# Altium footprint library DBLib.PcbLib: 97 footprints (part 1 of 7)
Each footprint in its own frame and in the unit in brackets; x right, y up, seen from the top. Pads: shape width x height; smd on the part's side, far side on the other; paste and mask are expansions set on the pad; w line width, h text height; cw(c..) or ccw(c..) is an arc to the next point about the centre after c.
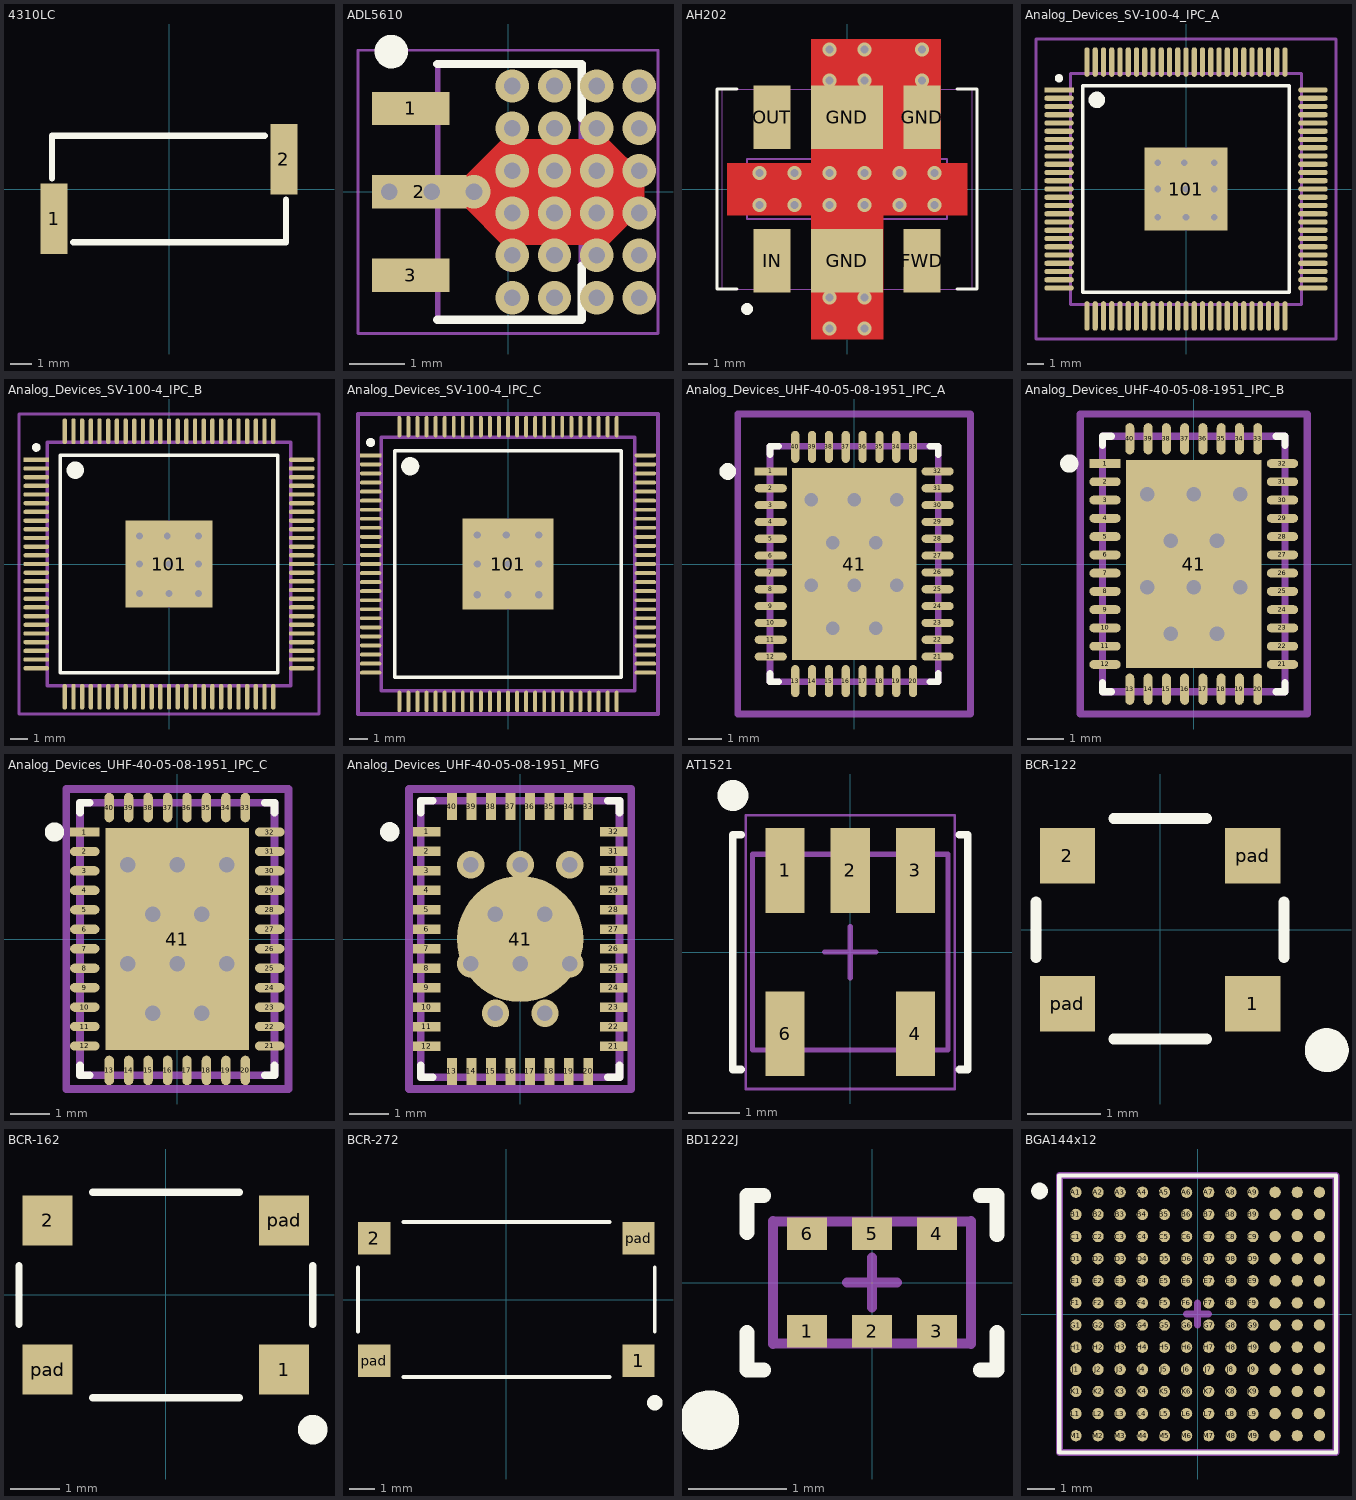
[diagram p0: the footprints below, top view; thin cyan lines are the x and y axes]

## 4310LC [mm] "Wideband Bias Choke"
height 3.3
pads (2):
  rect 1.27x3.3 smd: 1(-5.4,-1.395) 2(5.4,1.395)
Top Overlay:
  lines w0.3: -5.5,0.5 -5.5,2.5 4.5,2.5 ; -4.5,-2.5 5.5,-2.5 5.5,-0.5
3D body "Coilcraft-4310LC-XXX.STEP": height 3.39, standoff 0.01, extent -5.617,-2.489 5.668,2.591

## ADL5610 [mm] "SOT89, 3-Leads, Body 4,49x2,44mm, Pitch 1,50mm, Lead Span 4,0mm, IPC Medium Density"
height 1.6
pads (3):
  rect 1.4x0.6 smd: 1(-1.75,1.5) 3(-1.75,-1.5)
  rect 1.7x0.6 smd: 2(-1.6,0)
via 0.076,1.143 diameter 0.6 hole 0.3
via 0.838,1.143 diameter 0.6 hole 0.3
via 2.362,1.143 diameter 0.6 hole 0.3
via 2.362,1.905 diameter 0.6 hole 0.3
via 0.838,1.905 diameter 0.6 hole 0.3
via 0.076,1.905 diameter 0.6 hole 0.3
via -2.135,0 diameter 0.6 hole 0.3
via -1.373,0 diameter 0.6 hole 0.3
via -0.611,0 diameter 0.6 hole 0.3
via 0.076,0.381 diameter 0.6 hole 0.3
via 0.076,-0.381 diameter 0.6 hole 0.3
via 0.838,-0.381 diameter 0.6 hole 0.3
via 0.838,0.381 diameter 0.6 hole 0.3
via 2.362,0.381 diameter 0.6 hole 0.3
via 2.362,-0.381 diameter 0.6 hole 0.3
via 0.076,-1.905 diameter 0.6 hole 0.3
via 0.838,-1.905 diameter 0.6 hole 0.3
via 2.362,-1.905 diameter 0.6 hole 0.3
via 2.362,-1.143 diameter 0.6 hole 0.3
via 0.838,-1.143 diameter 0.6 hole 0.3
via 0.076,-1.143 diameter 0.6 hole 0.3
via 1.6,-1.143 diameter 0.6 hole 0.3
via 1.6,-1.905 diameter 0.6 hole 0.3
via 1.6,-0.381 diameter 0.6 hole 0.3
via 1.6,0.381 diameter 0.6 hole 0.3
via 1.6,1.905 diameter 0.6 hole 0.3
via 1.6,1.143 diameter 0.6 hole 0.3
Top Layer:
  region: -0.75,0.3 -0.1,0.95 1.8,0.95 2.45,0.3 2.45,-0.3 1.8,-0.95 -0.1,-0.95 -0.75,-0.3
Top Overlay:
  circle w0.35: c-2.1,2.525 r0.127
  lines w0.15: -1.272,-2.3 1.328,-2.3 1.328,-1.325 ; -1.272,2.3 1.328,2.3 1.328,1.325
Mechanical 1:
  lines w0.05: -2.7,-2.55 -2.7,2.55 2.7,2.55 2.7,-2.55 -2.7,-2.55
  lines w0.1: -0.473,0 0.527,0 ; 0.028,-0.5 0.028,0.5 ; -1.268,-2.3 -1.268,2.3 1.322,2.3 1.322,-2.3 -1.268,-2.3
3D body "User Library-SOT89-3.STEP": height 1.54, standoff 0, extent -2.222,-2.25 2.028,2.25

## AH202 [mil] "Mini-Circuits"
height 236.22
pads (6):
  rect 74x127 smd: FWD(150,-143.5) GND(150,143.5) IN(-150,-143.5) OUT(-150,143.5)
  rect 144x127 smd: GND(0,-143.5) GND(0,143.5)
via 35,-279 diameter 27.56 hole 15.75
via 35,-217 diameter 27.56 hole 15.75
via -35,-279 diameter 27.56 hole 15.75
via -35,-217 diameter 27.56 hole 15.75
via 150,279 diameter 27.56 hole 15.75
via 150,217 diameter 27.56 hole 15.75
via 35,279 diameter 27.56 hole 15.75
via -35,279 diameter 27.56 hole 15.75
via 35,217 diameter 27.56 hole 15.75
via -35,217 diameter 27.56 hole 15.75
via 175,-32 diameter 27.56 hole 15.75
via 175,32 diameter 27.56 hole 15.75
via 105,32 diameter 27.56 hole 15.75
via 105,-32 diameter 27.56 hole 15.75
via 35,-32 diameter 27.56 hole 15.75
via 35,32 diameter 27.56 hole 15.75
via -35,32 diameter 27.56 hole 15.75
via -105,32 diameter 27.56 hole 15.75
via -175,32 diameter 27.56 hole 15.75
via -175,-32 diameter 27.56 hole 15.75
via -105,-32 diameter 27.56 hole 15.75
via -35,-32 diameter 27.56 hole 15.75
Top Layer:
  region: -240,52 -72,52 -72,300 187,300 187,52 240,52 240,-52 72,-52 72,-300 -72,-300 -72,-52 -240,-52
Top Overlay:
  circle w13.78: c-200,-240 r5
  lines w5.91: -220,-200 -260,-200 -260,200 -220,200 ; 220,-200 260,-200 260,200 220,200
Top Solder:
  region: -76,211 -76,56 -244,56 -243,55 -243,-56 -76,-56 -76,-211 76,-211 76,-56 244,-56 244,56 76,56 76,211
Mechanical 1:
  lines w1.97: -250,-200 250,-200 250,200 -250,200 -250,-200
  lines w3.94: -19.68,0 19.68,0 ; 0,-19.68 0,19.68 ; -200,-60 200,-60 200,60 -200,60 -200,-60
3D body "User Library-AH202-1.step": height 251.38, standoff -1.4, extent -250,-189.96 250,189.96

## Analog_Devices_SV-100-4_IPC_A [mm]
pads (101):
  rect 1.788x0.312 smd paste+0 mask+0: 1(-7.691,6)
  rrect100% 1.788x0.312 smd paste+0 mask+0: 2(-7.691,5.5) 3(-7.691,5) 4(-7.691,4.5) 5(-7.691,4) 6(-7.691,3.5) 7(-7.691,3) 8(-7.691,2.5) 9(-7.691,2) 10(-7.691,1.5) 11(-7.691,1) 12(-7.691,0.5) 13(-7.691,0) 14(-7.691,-0.5) 15(-7.691,-1) 16(-7.691,-1.5) 17(-7.691,-2) 18(-7.691,-2.5) 19(-7.691,-3) 20(-7.691,-3.5) 21(-7.691,-4) 22(-7.691,-4.5) 23(-7.691,-5) 24(-7.691,-5.5) 25(-7.691,-6) 51(7.691,-6) 52(7.691,-5.5) 53(7.691,-5) 54(7.691,-4.5) 55(7.691,-4) 56(7.691,-3.5) 57(7.691,-3) 58(7.691,-2.5) 59(7.691,-2) 60(7.691,-1.5) 61(7.691,-1) 62(7.691,-0.5) 63(7.691,0) 64(7.691,0.5) 65(7.691,1) 66(7.691,1.5) 67(7.691,2) 68(7.691,2.5) 69(7.691,3) 70(7.691,3.5) 71(7.691,4) 72(7.691,4.5) 73(7.691,5) 74(7.691,5.5) 75(7.691,6)
  rrect100% 0.312x1.788 smd paste+0 mask+0: 26(-6,-7.691) 27(-5.5,-7.691) 28(-5,-7.691) 29(-4.5,-7.691) 30(-4,-7.691) 31(-3.5,-7.691) 32(-3,-7.691) 33(-2.5,-7.691) 34(-2,-7.691) 35(-1.5,-7.691) 36(-1,-7.691) 37(-0.5,-7.691) 38(0,-7.691) 39(0.5,-7.691) 40(1,-7.691) 41(1.5,-7.691) 42(2,-7.691) 43(2.5,-7.691) 44(3,-7.691) 45(3.5,-7.691) 46(4,-7.691) 47(4.5,-7.691) 48(5,-7.691) 49(5.5,-7.691) 50(6,-7.691) 76(6,7.691) 77(5.5,7.691) 78(5,7.691) 79(4.5,7.691) 80(4,7.691) 81(3.5,7.691) 82(3,7.691) 83(2.5,7.691) 84(2,7.691) 85(1.5,7.691) 86(1,7.691) 87(0.5,7.691) 88(0,7.691) 89(-0.5,7.691) 90(-1,7.691) 91(-1.5,7.691) 92(-2,7.691) 93(-2.5,7.691) 94(-3,7.691) 95(-3.5,7.691) 96(-4,7.691) 97(-4.5,7.691) 98(-5,7.691) 99(-5.5,7.691) 100(-6,7.691)
  rect 5x5 all layers, no hole paste-1000 mask+0: 101(0,0)
via 1.7,0 diameter 0.7 hole 0.4
via 0,0 diameter 0.7 hole 0.4
via -0.1,1.6 diameter 0.7 hole 0.4
via -1.7,1.6 diameter 0.7 hole 0.4
via -1.7,0 diameter 0.7 hole 0.4
via 1.7,1.6 diameter 0.7 hole 0.4
via 0,-1.7 diameter 0.7 hole 0.4
via -1.7,-1.7 diameter 0.7 hole 0.4
via 1.7,-1.7 diameter 0.7 hole 0.4
Top Overlay:
  circle w0.5: c-5.4,5.4 r0.25
  circle w0.25: c-7.691,6.71 r0.125
  lines w0.2: -6.25,-6.25 -6.25,6.25 6.25,6.25 6.25,-6.25 -6.25,-6.25
Top Paste:
  rectangle: 0.306,-1.887 1.887,-0.306
  rectangle: -1.887,-1.887 -0.306,-0.306
  rectangle: 0.306,0.306 1.887,1.887
  rectangle: -1.887,0.306 -0.306,1.887
Mechanical 10:
  lines w0.2: -9.085,-9.085 -9.085,9.085 9.085,9.085 9.085,-9.085 -9.085,-9.085
Mechanical 12:
  lines w0.2: -7,-7 -7,7 7,7 7,-7 -7,-7
Mechanical 15:
  lines w0.1: -0.5,0 0.5,0 ; 0,-0.5 0,0.5
  lines w0.2: -9.085,-9.085 -9.085,9.085 9.085,9.085 9.085,-9.085 -9.085,-9.085
3D body "User Library-TQFP100.step": height 1.14, standoff -0.01, extent -8,-8 8,8

## Analog_Devices_SV-100-4_IPC_B [mm]
pads (101):
  rect 1.488x0.252 smd paste+0 mask+0: 1(-7.641,6)
  rrect100% 1.488x0.252 smd paste+0 mask+0: 2(-7.641,5.5) 3(-7.641,5) 4(-7.641,4.5) 5(-7.641,4) 6(-7.641,3.5) 7(-7.641,3) 8(-7.641,2.5) 9(-7.641,2) 10(-7.641,1.5) 11(-7.641,1) 12(-7.641,0.5) 13(-7.641,0) 14(-7.641,-0.5) 15(-7.641,-1) 16(-7.641,-1.5) 17(-7.641,-2) 18(-7.641,-2.5) 19(-7.641,-3) 20(-7.641,-3.5) 21(-7.641,-4) 22(-7.641,-4.5) 23(-7.641,-5) 24(-7.641,-5.5) 25(-7.641,-6) 51(7.641,-6) 52(7.641,-5.5) 53(7.641,-5) 54(7.641,-4.5) 55(7.641,-4) 56(7.641,-3.5) 57(7.641,-3) 58(7.641,-2.5) 59(7.641,-2) 60(7.641,-1.5) 61(7.641,-1) 62(7.641,-0.5) 63(7.641,0) 64(7.641,0.5) 65(7.641,1) 66(7.641,1.5) 67(7.641,2) 68(7.641,2.5) 69(7.641,3) 70(7.641,3.5) 71(7.641,4) 72(7.641,4.5) 73(7.641,5) 74(7.641,5.5) 75(7.641,6)
  rrect100% 0.252x1.488 smd paste+0 mask+0: 26(-6,-7.641) 27(-5.5,-7.641) 28(-5,-7.641) 29(-4.5,-7.641) 30(-4,-7.641) 31(-3.5,-7.641) 32(-3,-7.641) 33(-2.5,-7.641) 34(-2,-7.641) 35(-1.5,-7.641) 36(-1,-7.641) 37(-0.5,-7.641) 38(0,-7.641) 39(0.5,-7.641) 40(1,-7.641) 41(1.5,-7.641) 42(2,-7.641) 43(2.5,-7.641) 44(3,-7.641) 45(3.5,-7.641) 46(4,-7.641) 47(4.5,-7.641) 48(5,-7.641) 49(5.5,-7.641) 50(6,-7.641) 76(6,7.641) 77(5.5,7.641) 78(5,7.641) 79(4.5,7.641) 80(4,7.641) 81(3.5,7.641) 82(3,7.641) 83(2.5,7.641) 84(2,7.641) 85(1.5,7.641) 86(1,7.641) 87(0.5,7.641) 88(0,7.641) 89(-0.5,7.641) 90(-1,7.641) 91(-1.5,7.641) 92(-2,7.641) 93(-2.5,7.641) 94(-3,7.641) 95(-3.5,7.641) 96(-4,7.641) 97(-4.5,7.641) 98(-5,7.641) 99(-5.5,7.641) 100(-6,7.641)
  rect 5x5 all layers, no hole paste-1000 mask+0: 101(0,0)
via 1.7,-1.7 diameter 0.7 hole 0.4
via -1.7,-1.7 diameter 0.7 hole 0.4
via 0,-1.7 diameter 0.7 hole 0.4
via 1.7,1.6 diameter 0.7 hole 0.4
via -1.7,0 diameter 0.7 hole 0.4
via -1.7,1.6 diameter 0.7 hole 0.4
via -0.1,1.6 diameter 0.7 hole 0.4
via 0,0 diameter 0.7 hole 0.4
via 1.7,0 diameter 0.7 hole 0.4
Top Overlay:
  circle w0.5: c-5.4,5.4 r0.25
  circle w0.25: c-7.641,6.71 r0.125
  lines w0.2: -6.25,-6.25 -6.25,6.25 6.25,6.25 6.25,-6.25 -6.25,-6.25
Top Paste:
  rectangle: 0.306,-1.887 1.887,-0.306
  rectangle: -1.887,-1.887 -0.306,-0.306
  rectangle: 0.306,0.306 1.887,1.887
  rectangle: -1.887,0.306 -0.306,1.887
Mechanical 10:
  lines w0.2: -8.635,-8.635 -8.635,8.635 8.635,8.635 8.635,-8.635 -8.635,-8.635
Mechanical 12:
  lines w0.2: -7,-7 -7,7 7,7 7,-7 -7,-7
Mechanical 15:
  lines w0.1: -0.5,0 0.5,0 ; 0,-0.5 0,0.5
  lines w0.2: -8.635,-8.635 -8.635,8.635 8.635,8.635 8.635,-8.635 -8.635,-8.635
3D body "User Library-TQFP100.step": height 1.14, standoff -0.01, extent -8,-8 8,8

## Analog_Devices_SV-100-4_IPC_C [mm]
pads (101):
  rect 1.188x0.212 smd paste+0 mask+0: 1(-7.591,6)
  rrect100% 1.188x0.212 smd paste+0 mask+0: 2(-7.591,5.5) 3(-7.591,5) 4(-7.591,4.5) 5(-7.591,4) 6(-7.591,3.5) 7(-7.591,3) 8(-7.591,2.5) 9(-7.591,2) 10(-7.591,1.5) 11(-7.591,1) 12(-7.591,0.5) 13(-7.591,0) 14(-7.591,-0.5) 15(-7.591,-1) 16(-7.591,-1.5) 17(-7.591,-2) 18(-7.591,-2.5) 19(-7.591,-3) 20(-7.591,-3.5) 21(-7.591,-4) 22(-7.591,-4.5) 23(-7.591,-5) 24(-7.591,-5.5) 25(-7.591,-6) 51(7.591,-6) 52(7.591,-5.5) 53(7.591,-5) 54(7.591,-4.5) 55(7.591,-4) 56(7.591,-3.5) 57(7.591,-3) 58(7.591,-2.5) 59(7.591,-2) 60(7.591,-1.5) 61(7.591,-1) 62(7.591,-0.5) 63(7.591,0) 64(7.591,0.5) 65(7.591,1) 66(7.591,1.5) 67(7.591,2) 68(7.591,2.5) 69(7.591,3) 70(7.591,3.5) 71(7.591,4) 72(7.591,4.5) 73(7.591,5) 74(7.591,5.5) 75(7.591,6)
  rrect100% 0.212x1.188 smd paste+0 mask+0: 26(-6,-7.591) 27(-5.5,-7.591) 28(-5,-7.591) 29(-4.5,-7.591) 30(-4,-7.591) 31(-3.5,-7.591) 32(-3,-7.591) 33(-2.5,-7.591) 34(-2,-7.591) 35(-1.5,-7.591) 36(-1,-7.591) 37(-0.5,-7.591) 38(0,-7.591) 39(0.5,-7.591) 40(1,-7.591) 41(1.5,-7.591) 42(2,-7.591) 43(2.5,-7.591) 44(3,-7.591) 45(3.5,-7.591) 46(4,-7.591) 47(4.5,-7.591) 48(5,-7.591) 49(5.5,-7.591) 50(6,-7.591) 76(6,7.591) 77(5.5,7.591) 78(5,7.591) 79(4.5,7.591) 80(4,7.591) 81(3.5,7.591) 82(3,7.591) 83(2.5,7.591) 84(2,7.591) 85(1.5,7.591) 86(1,7.591) 87(0.5,7.591) 88(0,7.591) 89(-0.5,7.591) 90(-1,7.591) 91(-1.5,7.591) 92(-2,7.591) 93(-2.5,7.591) 94(-3,7.591) 95(-3.5,7.591) 96(-4,7.591) 97(-4.5,7.591) 98(-5,7.591) 99(-5.5,7.591) 100(-6,7.591)
  rect 5x5 all layers, no hole paste-1000 mask+0: 101(0,0)
via 1.7,0 diameter 0.7 hole 0.4
via 0,0 diameter 0.7 hole 0.4
via -0.1,1.6 diameter 0.7 hole 0.4
via -1.7,1.6 diameter 0.7 hole 0.4
via -1.7,0 diameter 0.7 hole 0.4
via 1.7,1.6 diameter 0.7 hole 0.4
via 0,-1.7 diameter 0.7 hole 0.4
via -1.7,-1.7 diameter 0.7 hole 0.4
via 1.7,-1.7 diameter 0.7 hole 0.4
Top Overlay:
  circle w0.5: c-5.4,5.4 r0.25
  circle w0.25: c-7.591,6.71 r0.125
  lines w0.2: -6.25,-6.25 -6.25,6.25 6.25,6.25 6.25,-6.25 -6.25,-6.25
Top Paste:
  rectangle: 0.306,-1.887 1.887,-0.306
  rectangle: -1.887,-1.887 -0.306,-0.306
  rectangle: 0.306,0.306 1.887,1.887
  rectangle: -1.887,0.306 -0.306,1.887
Mechanical 10:
  lines w0.2: -8.285,-8.285 -8.285,8.285 8.285,8.285 8.285,-8.285 -8.285,-8.285
Mechanical 12:
  lines w0.2: -7,-7 -7,7 7,7 7,-7 -7,-7
Mechanical 15:
  lines w0.1: -0.5,0 0.5,0 ; 0,-0.5 0,0.5
  lines w0.2: -8.285,-8.285 -8.285,8.285 8.285,8.285 8.285,-8.285 -8.285,-8.285
3D body "User Library-TQFP100.step": height 1.14, standoff -0.01, extent -8,-8 8,8

## Analog_Devices_UHF-40-05-08-1951_IPC_A [mm]
pads (41):
  rect 0.956x0.242 smd paste+0 mask+0: 1(-2.478,2.75)
  rrect100% 0.956x0.242 smd paste+0 mask+0: 2(-2.478,2.25) 3(-2.478,1.75) 4(-2.478,1.25) 5(-2.478,0.75) 6(-2.478,0.25) 7(-2.478,-0.25) 8(-2.478,-0.75) 9(-2.478,-1.25) 10(-2.478,-1.75) 11(-2.478,-2.25) 12(-2.478,-2.75) 21(2.478,-2.75) 22(2.478,-2.25) 23(2.478,-1.75) 24(2.478,-1.25) 25(2.478,-0.75) 26(2.478,-0.25) 27(2.478,0.25) 28(2.478,0.75) 29(2.478,1.25) 30(2.478,1.75) 31(2.478,2.25) 32(2.478,2.75)
  rrect100% 0.242x0.956 smd paste+0 mask+0: 13(-1.75,-3.478) 14(-1.25,-3.478) 15(-0.75,-3.478) 16(-0.25,-3.478) 17(0.25,-3.478) 18(0.75,-3.478) 19(1.25,-3.478) 20(1.75,-3.478) 33(1.75,3.478) 34(1.25,3.478) 35(0.75,3.478) 36(0.25,3.478) 37(-0.25,3.478) 38(-0.75,3.478) 39(-1.25,3.478) 40(-1.75,3.478)
  rect 3.7x5.7 all layers, no hole paste-1000 mask+0.102: 41(0,0)
via 1.27,1.905 diameter 0.7 hole 0.4
via 0,1.905 diameter 0.7 hole 0.4
via -1.27,1.905 diameter 0.7 hole 0.4
via 0.635,-1.905 diameter 0.7 hole 0.4
via -0.635,-1.905 diameter 0.7 hole 0.4
via 1.27,-0.635 diameter 0.7 hole 0.4
via 0,-0.635 diameter 0.7 hole 0.4
via -1.27,-0.635 diameter 0.7 hole 0.4
via 0.635,0.635 diameter 0.7 hole 0.4
via -0.635,0.635 diameter 0.7 hole 0.4
Top Overlay:
  circle w0.25: c-3.756,2.75 r0.125
  lines w0.2: -2.5,-3.25 -2.5,-3.5 -2.25,-3.5 ; -2.5,3.25 -2.5,3.5 -2.25,3.5 ; 2.25,-3.5 2.5,-3.5 2.5,-3.25 ; 2.25,3.5 2.5,3.5 2.5,3.25
Top Paste:
  rectangle: -1.243,0.303 1.243,2.243
  rectangle: -1.243,-2.243 1.243,-0.303
Mechanical 10:
  lines w0.2: -3.456,-4.456 3.456,-4.456 3.456,4.456 -3.456,4.456 -3.456,-4.456
Mechanical 12:
  lines w0.2: -2.5,-3.5 2.5,-3.5 2.5,3.5 -2.5,3.5 -2.5,-3.5
Mechanical 15:
  lines w0.1: -0.5,0 0.5,0 ; 0,-0.5 0,0.5
  lines w0.2: -3.456,-4.456 3.456,-4.456 3.456,4.456 -3.456,4.456 -3.456,-4.456
3D body "IC_Analog_Devices_LTC6951IUHF#PBF_eec.STEP": height 0.25, standoff 0, extent -3.456,-4.456 3.456,4.456

## Analog_Devices_UHF-40-05-08-1951_IPC_B [mm]
pads (41):
  rect 0.856x0.242 smd paste+0 mask+0: 1(-2.428,2.75)
  rrect100% 0.856x0.242 smd paste+0 mask+0: 2(-2.428,2.25) 3(-2.428,1.75) 4(-2.428,1.25) 5(-2.428,0.75) 6(-2.428,0.25) 7(-2.428,-0.25) 8(-2.428,-0.75) 9(-2.428,-1.25) 10(-2.428,-1.75) 11(-2.428,-2.25) 12(-2.428,-2.75) 21(2.428,-2.75) 22(2.428,-2.25) 23(2.428,-1.75) 24(2.428,-1.25) 25(2.428,-0.75) 26(2.428,-0.25) 27(2.428,0.25) 28(2.428,0.75) 29(2.428,1.25) 30(2.428,1.75) 31(2.428,2.25) 32(2.428,2.75)
  rrect100% 0.242x0.856 smd paste+0 mask+0: 13(-1.75,-3.428) 14(-1.25,-3.428) 15(-0.75,-3.428) 16(-0.25,-3.428) 17(0.25,-3.428) 18(0.75,-3.428) 19(1.25,-3.428) 20(1.75,-3.428) 33(1.75,3.428) 34(1.25,3.428) 35(0.75,3.428) 36(0.25,3.428) 37(-0.25,3.428) 38(-0.75,3.428) 39(-1.25,3.428) 40(-1.75,3.428)
  rect 3.7x5.7 all layers, no hole paste-1000 mask+0.102: 41(0,0)
via 1.27,1.905 diameter 0.7 hole 0.4
via 0,1.905 diameter 0.7 hole 0.4
via -1.27,1.905 diameter 0.7 hole 0.4
via 0.635,-1.905 diameter 0.7 hole 0.4
via -0.635,-1.905 diameter 0.7 hole 0.4
via 1.27,-0.635 diameter 0.7 hole 0.4
via 0,-0.635 diameter 0.7 hole 0.4
via -1.27,-0.635 diameter 0.7 hole 0.4
via 0.635,0.635 diameter 0.7 hole 0.4
via -0.635,0.635 diameter 0.7 hole 0.4
Top Overlay:
  circle w0.25: c-3.406,2.75 r0.125
  lines w0.2: -2.5,-3.25 -2.5,-3.5 -2.25,-3.5 ; -2.5,3.25 -2.5,3.5 -2.25,3.5 ; 2.25,-3.5 2.5,-3.5 2.5,-3.25 ; 2.25,3.5 2.5,3.5 2.5,3.25
Top Paste:
  rectangle: -1.243,-2.243 1.243,-0.303
  rectangle: -1.243,0.303 1.243,2.243
Mechanical 10:
  lines w0.2: -3.106,-4.106 -3.106,4.106 3.106,4.106 3.106,-4.106 -3.106,-4.106
Mechanical 12:
  lines w0.2: -2.5,-3.5 -2.5,3.5 2.5,3.5 2.5,-3.5 -2.5,-3.5
Mechanical 15:
  lines w0.1: -0.5,0 0.5,0 ; 0,-0.5 0,0.5
  lines w0.2: -3.106,-4.106 -3.106,4.106 3.106,4.106 3.106,-4.106 -3.106,-4.106
3D body "IC_Analog_Devices_LTC6951IUHF#PBF_eec.STEP": height 0.25, standoff 0, extent -3.106,-4.106 3.106,4.106

## Analog_Devices_UHF-40-05-08-1951_IPC_C [mm]
pads (41):
  rect 0.756x0.242 smd paste+0 mask+0: 1(-2.378,2.75)
  rrect100% 0.756x0.242 smd paste+0 mask+0: 2(-2.378,2.25) 3(-2.378,1.75) 4(-2.378,1.25) 5(-2.378,0.75) 6(-2.378,0.25) 7(-2.378,-0.25) 8(-2.378,-0.75) 9(-2.378,-1.25) 10(-2.378,-1.75) 11(-2.378,-2.25) 12(-2.378,-2.75) 21(2.378,-2.75) 22(2.378,-2.25) 23(2.378,-1.75) 24(2.378,-1.25) 25(2.378,-0.75) 26(2.378,-0.25) 27(2.378,0.25) 28(2.378,0.75) 29(2.378,1.25) 30(2.378,1.75) 31(2.378,2.25) 32(2.378,2.75)
  rrect100% 0.242x0.756 smd paste+0 mask+0: 13(-1.75,-3.378) 14(-1.25,-3.378) 15(-0.75,-3.378) 16(-0.25,-3.378) 17(0.25,-3.378) 18(0.75,-3.378) 19(1.25,-3.378) 20(1.75,-3.378) 33(1.75,3.378) 34(1.25,3.378) 35(0.75,3.378) 36(0.25,3.378) 37(-0.25,3.378) 38(-0.75,3.378) 39(-1.25,3.378) 40(-1.75,3.378)
  rect 3.7x5.7 all layers, no hole paste-1000 mask+0.102: 41(0,0)
via 1.27,1.905 diameter 0.7 hole 0.4
via 0,1.905 diameter 0.7 hole 0.4
via -1.27,1.905 diameter 0.7 hole 0.4
via 0.635,-1.905 diameter 0.7 hole 0.4
via -0.635,-1.905 diameter 0.7 hole 0.4
via 1.27,-0.635 diameter 0.7 hole 0.4
via 0,-0.635 diameter 0.7 hole 0.4
via -1.27,-0.635 diameter 0.7 hole 0.4
via 0.635,0.635 diameter 0.7 hole 0.4
via -0.635,0.635 diameter 0.7 hole 0.4
Top Overlay:
  circle w0.25: c-3.156,2.75 r0.125
  lines w0.2: -2.5,-3.25 -2.5,-3.5 -2.25,-3.5 ; -2.5,3.25 -2.5,3.5 -2.25,3.5 ; 2.25,-3.5 2.5,-3.5 2.5,-3.25 ; 2.25,3.5 2.5,3.5 2.5,3.25
Top Paste:
  rectangle: -1.243,-2.243 1.243,-0.303
  rectangle: -1.243,0.303 1.243,2.243
Mechanical 10:
  lines w0.2: -2.856,-3.856 -2.856,3.856 2.856,3.856 2.856,-3.856 -2.856,-3.856
Mechanical 12:
  lines w0.2: -2.5,-3.5 -2.5,3.5 2.5,3.5 2.5,-3.5 -2.5,-3.5
Mechanical 15:
  lines w0.1: -0.5,0 0.5,0 ; 0,-0.5 0,0.5
  lines w0.2: -2.856,-3.856 -2.856,3.856 2.856,3.856 2.856,-3.856 -2.856,-3.856
3D body "IC_Analog_Devices_LTC6951IUHF#PBF_eec.STEP": height 0.25, standoff 0, extent -2.856,-3.856 2.856,3.856

## Analog_Devices_UHF-40-05-08-1951_MFG [mm]
pads (41):
  rect 0.7x0.25 smd paste+0 mask+0: 1(-2.4,2.75) 2(-2.4,2.25) 3(-2.4,1.75) 4(-2.4,1.25) 5(-2.4,0.75) 6(-2.4,0.25) 7(-2.4,-0.25) 8(-2.4,-0.75) 9(-2.4,-1.25) 10(-2.4,-1.75) 11(-2.4,-2.25) 12(-2.4,-2.75) 21(2.4,-2.75) 22(2.4,-2.25) 23(2.4,-1.75) 24(2.4,-1.25) 25(2.4,-0.75) 26(2.4,-0.25) 27(2.4,0.25) 28(2.4,0.75) 29(2.4,1.25) 30(2.4,1.75) 31(2.4,2.25) 32(2.4,2.75)
  rect 0.25x0.7 smd paste+0 mask+0: 13(-1.75,-3.4) 14(-1.25,-3.4) 15(-0.75,-3.4) 16(-0.25,-3.4) 17(0.25,-3.4) 18(0.75,-3.4) 19(1.25,-3.4) 20(1.75,-3.4) 33(1.75,3.4) 34(1.25,3.4) 35(0.75,3.4) 36(0.25,3.4) 37(-0.25,3.4) 38(-0.75,3.4) 39(-1.25,3.4) 40(-1.75,3.4)
  round 3.24 smd paste+0 mask+0: 41(0,0)
via 1.27,1.905 diameter 0.7 hole 0.4
via 0,1.905 diameter 0.7 hole 0.4
via -1.27,1.905 diameter 0.7 hole 0.4
via 0.635,-1.905 diameter 0.7 hole 0.4
via -0.635,-1.905 diameter 0.7 hole 0.4
via 1.27,-0.635 diameter 0.7 hole 0.4
via 0,-0.635 diameter 0.7 hole 0.4
via -1.27,-0.635 diameter 0.7 hole 0.4
via 0.635,0.635 diameter 0.7 hole 0.4
via -0.635,0.635 diameter 0.7 hole 0.4
Top Overlay:
  circle w0.25: c-3.35,2.75 r0.125
  lines w0.2: -2.55,-3.25 -2.55,-3.55 -2.25,-3.55 ; -2.55,3.25 -2.55,3.55 -2.25,3.55 ; 2.25,-3.55 2.55,-3.55 2.55,-3.25 ; 2.25,3.55 2.55,3.55 2.55,3.25
Mechanical 10:
  lines w0.2: -2.85,-3.85 -2.85,3.85 2.85,3.85 2.85,-3.85 -2.85,-3.85
Mechanical 12:
  lines w0.2: -2.55,-3.55 -2.55,3.55 2.55,3.55 2.55,-3.55 -2.55,-3.55
Mechanical 15:
  lines w0.1: -0.5,0 0.5,0 ; 0,-0.5 0,0.5
  lines w0.2: -2.85,-3.85 -2.85,3.85 2.85,3.85 2.85,-3.85 -2.85,-3.85
Multi-Layer:
  region: -1.8,-2.8 1.8,-2.8 1.8,2.8 -1.45,2.8 -1.8,2.45
3D body "IC_Analog_Devices_LTC6951IUHF#PBF_eec.STEP": height 0.25, standoff 0, extent -2.85,-3.85 2.85,3.85

## AT1521 [mm] "RF Transformer"
height 4.06
pads (5):
  rect 0.76x1.65 smd: 1(-1.27,1.59) 2(0,1.59) 3(1.27,1.59) 4(1.27,-1.59) 6(-1.27,-1.59)
Top Overlay:
  circle w0.35: c-2.286,3.048 r0.127
  lines w0.15: -2.126,-2.286 -2.286,-2.286 -2.286,2.286 -2.126,2.286 ; 2.126,-2.286 2.286,-2.286 2.286,2.286 2.126,2.286
Mechanical 1:
  lines w0.05: -2.032,-2.667 -2.032,2.667 2.032,2.667 2.032,-2.667 -2.032,-2.667
  lines w0.1: -0.5,0 0.5,0 ; 0,-0.5 0,0.5 ; -1.905,-1.905 -1.905,1.905 1.905,1.905 1.905,-1.905 -1.905,-1.905
3D body "User Library-RF Transformer SMD.step": height 2.79, standoff -0.02, extent -1.905,-1.923 1.905,1.923

## BCR-122 [mm] "Broadband Conical Inductors"
height 2.79
pads (4):
  rect 0.76x0.76 smd: 1(1.27,-1.015) 2(-1.27,1.015) pad(-1.27,-1.015) pad(1.27,1.015)
Top Overlay:
  circle w0.35: c2.286,-1.651 r0.127
  lines w0.15: -1.702,-0.381 -1.702,0.381 ; -0.635,-1.499 0.635,-1.499 ; -0.635,1.524 0.635,1.524 ; 1.702,-0.381 1.702,0.381
3D body "Coilcraft-BCR-122.step": height 3.04, standoff 0, extent -1.65,-1.46 1.65,1.46

## BCR-162 [mm] "Broadband Conical Inductors"
height 4.06
pads (4):
  rect 1.02x1.02 smd: 1(2.415,-1.525) 2(-2.415,1.525) pad(-2.415,-1.525) pad(2.415,1.525)
Top Overlay:
  circle w0.35: c3,-2.75 r0.127
  lines w0.15: -3,-0.6 -3,0.6 ; -1.5,-2.1 1.5,-2.1 ; -1.5,2.1 1.5,2.1 ; 3,-0.6 3,0.6
3D body "Coilcraft-BCR-802.step": height 4.31, standoff 0, extent -2.905,-2.03 2.905,2.03

## BCR-272 [mm] "Broadband Conical Inductors"
height 5.59
pads (4):
  rect 1.27x1.27 smd: 1(5.205,-2.415) 2(-5.205,2.415) pad(-5.205,-2.415) pad(5.205,2.415)
Top Overlay:
  circle w0.35: c5.842,-4.064 r0.127
  lines w0.15: -5.842,-1.27 -5.842,1.27 ; -4.064,-3.048 4.064,-3.048 ; -4.064,3.048 4.064,3.048 ; 5.842,-1.27 5.842,1.27
3D body "Coilcraft-BCR-272.step": height 5.79, standoff -0.05, extent -5.715,-2.92 5.715,2.92

## BD1222J [mm] "Low Profile 0805 Balun"
height 0.7
pads (6):
  rect 0.41x0.33 smd: 1(-0.66,-0.495) 2(0,-0.495) 3(0.66,-0.495) 4(0.66,0.495) 5(0,0.495) 6(-0.66,0.495)
Top Overlay:
  circle w0.35: c-1.651,-1.397 r0.127
  lines w0.15: -1.27,-0.508 -1.27,-0.889 -1.101,-0.889 ; -1.27,0.508 -1.27,0.886 -1.101,0.886 ; 1.101,-0.889 1.27,-0.889 1.27,-0.508 ; 1.101,0.886 1.27,0.886 1.27,0.486
Mechanical 1:
  lines w0.1: -1.005,-0.625 -1.005,0.625 ; -1.005,-0.62 1,-0.62 ; -1.005,0.62 1,0.62 ; -0.254,0 0.254,0 ; 0,-0.254 0,0.254 ; 1.005,-0.625 1.005,0.625
3D body "User Library-B0322J5050AHF.step": height 0.7, standoff -0.01, extent -1.02,-0.645 1.02,0.645

## BGA144x12 [mm]
pads (144):
  round 0.41 smd: A1(-4.4,4.4) A2(-3.6,4.4) A3(-2.8,4.4) A4(-2,4.4) A5(-1.2,4.4) A6(-0.4,4.4) A7(0.4,4.4) A8(1.2,4.4) A9(2,4.4) A10(2.8,4.4) A11(3.6,4.4) A12(4.4,4.4) B1(-4.4,3.6) B2(-3.6,3.6) B3(-2.8,3.6) B4(-2,3.6) B5(-1.2,3.6) B6(-0.4,3.6) B7(0.4,3.6) B8(1.2,3.6) B9(2,3.6) B10(2.8,3.6) B11(3.6,3.6) B12(4.4,3.6) C1(-4.4,2.8) C2(-3.6,2.8) C3(-2.8,2.8) C4(-2,2.8) C5(-1.2,2.8) C6(-0.4,2.8) C7(0.4,2.8) C8(1.2,2.8) C9(2,2.8) C10(2.8,2.8) C11(3.6,2.8) C12(4.4,2.8) D1(-4.4,2) D2(-3.6,2) D3(-2.8,2) D4(-2,2) D5(-1.2,2) D6(-0.4,2) D7(0.4,2) D8(1.2,2) D9(2,2) D10(2.8,2) D11(3.6,2) D12(4.4,2) E1(-4.4,1.2) E2(-3.6,1.2) E3(-2.8,1.2) E4(-2,1.2) E5(-1.2,1.2) E6(-0.4,1.2) E7(0.4,1.2) E8(1.2,1.2) E9(2,1.2) E10(2.8,1.2) E11(3.6,1.2) E12(4.4,1.2) F1(-4.4,0.4) F2(-3.6,0.4) F3(-2.8,0.4) F4(-2,0.4) F5(-1.2,0.4) F6(-0.4,0.4) F7(0.4,0.4) F8(1.2,0.4) F9(2,0.4) F10(2.8,0.4) F11(3.6,0.4) F12(4.4,0.4) G1(-4.4,-0.4) G2(-3.6,-0.4) G3(-2.8,-0.4) G4(-2,-0.4) G5(-1.2,-0.4) G6(-0.4,-0.4) G7(0.4,-0.4) G8(1.2,-0.4) G9(2,-0.4) G10(2.8,-0.4) G11(3.6,-0.4) G12(4.4,-0.4) H1(-4.4,-1.2) H2(-3.6,-1.2) H3(-2.8,-1.2) H4(-2,-1.2) H5(-1.2,-1.2) H6(-0.4,-1.2) H7(0.4,-1.2) H8(1.2,-1.2) H9(2,-1.2) H10(2.8,-1.2) H11(3.6,-1.2) H12(4.4,-1.2) J1(-4.4,-2) J2(-3.6,-2) J3(-2.8,-2) J4(-2,-2) J5(-1.2,-2) J6(-0.4,-2) J7(0.4,-2) J8(1.2,-2) J9(2,-2) J10(2.8,-2) J11(3.6,-2) J12(4.4,-2) K1(-4.4,-2.8) K2(-3.6,-2.8) K3(-2.8,-2.8) K4(-2,-2.8) K5(-1.2,-2.8) K6(-0.4,-2.8) K7(0.4,-2.8) K8(1.2,-2.8) K9(2,-2.8) K10(2.8,-2.8) K11(3.6,-2.8) K12(4.4,-2.8) L1(-4.4,-3.6) L2(-3.6,-3.6) L3(-2.8,-3.6) L4(-2,-3.6) L5(-1.2,-3.6) L6(-0.4,-3.6) L7(0.4,-3.6) L8(1.2,-3.6) L9(2,-3.6) L10(2.8,-3.6) L11(3.6,-3.6) L12(4.4,-3.6) M1(-4.4,-4.4) M2(-3.6,-4.4) M3(-2.8,-4.4) M4(-2,-4.4) M5(-1.2,-4.4) M6(-0.4,-4.4) M7(0.4,-4.4) M8(1.2,-4.4) M9(2,-4.4) M10(2.8,-4.4) M11(3.6,-4.4) M12(4.4,-4.4)
Top Overlay:
  circle w0.35: c-5.715,4.445 r0.127
  lines w0.15: -5,-5 -5,5 5,5 5,-5 -5,-5
Mechanical 1:
  lines w0.254: -0.4,0 0.4,0 ; 0,-0.4 0,0.4 ; -5,-5 -5,5 5,5 5,-5 -5,-5
3D body "User Library-BGA 144.step": height 1.2, standoff -0.05, extent -5,-5 5,5